# Altium footprint library LOGTURTLE_APR_25_TX.PcbLib: 88 footprints (part 1 of 6)
Each footprint in its own frame and in the unit in brackets; x right, y up, seen from the top. Pads: shape width x height; smd on the part's side, far side on the other; paste and mask are expansions set on the pad; w line width, h text height; cw(c..) or ccw(c..) is an arc to the next point about the centre after c.
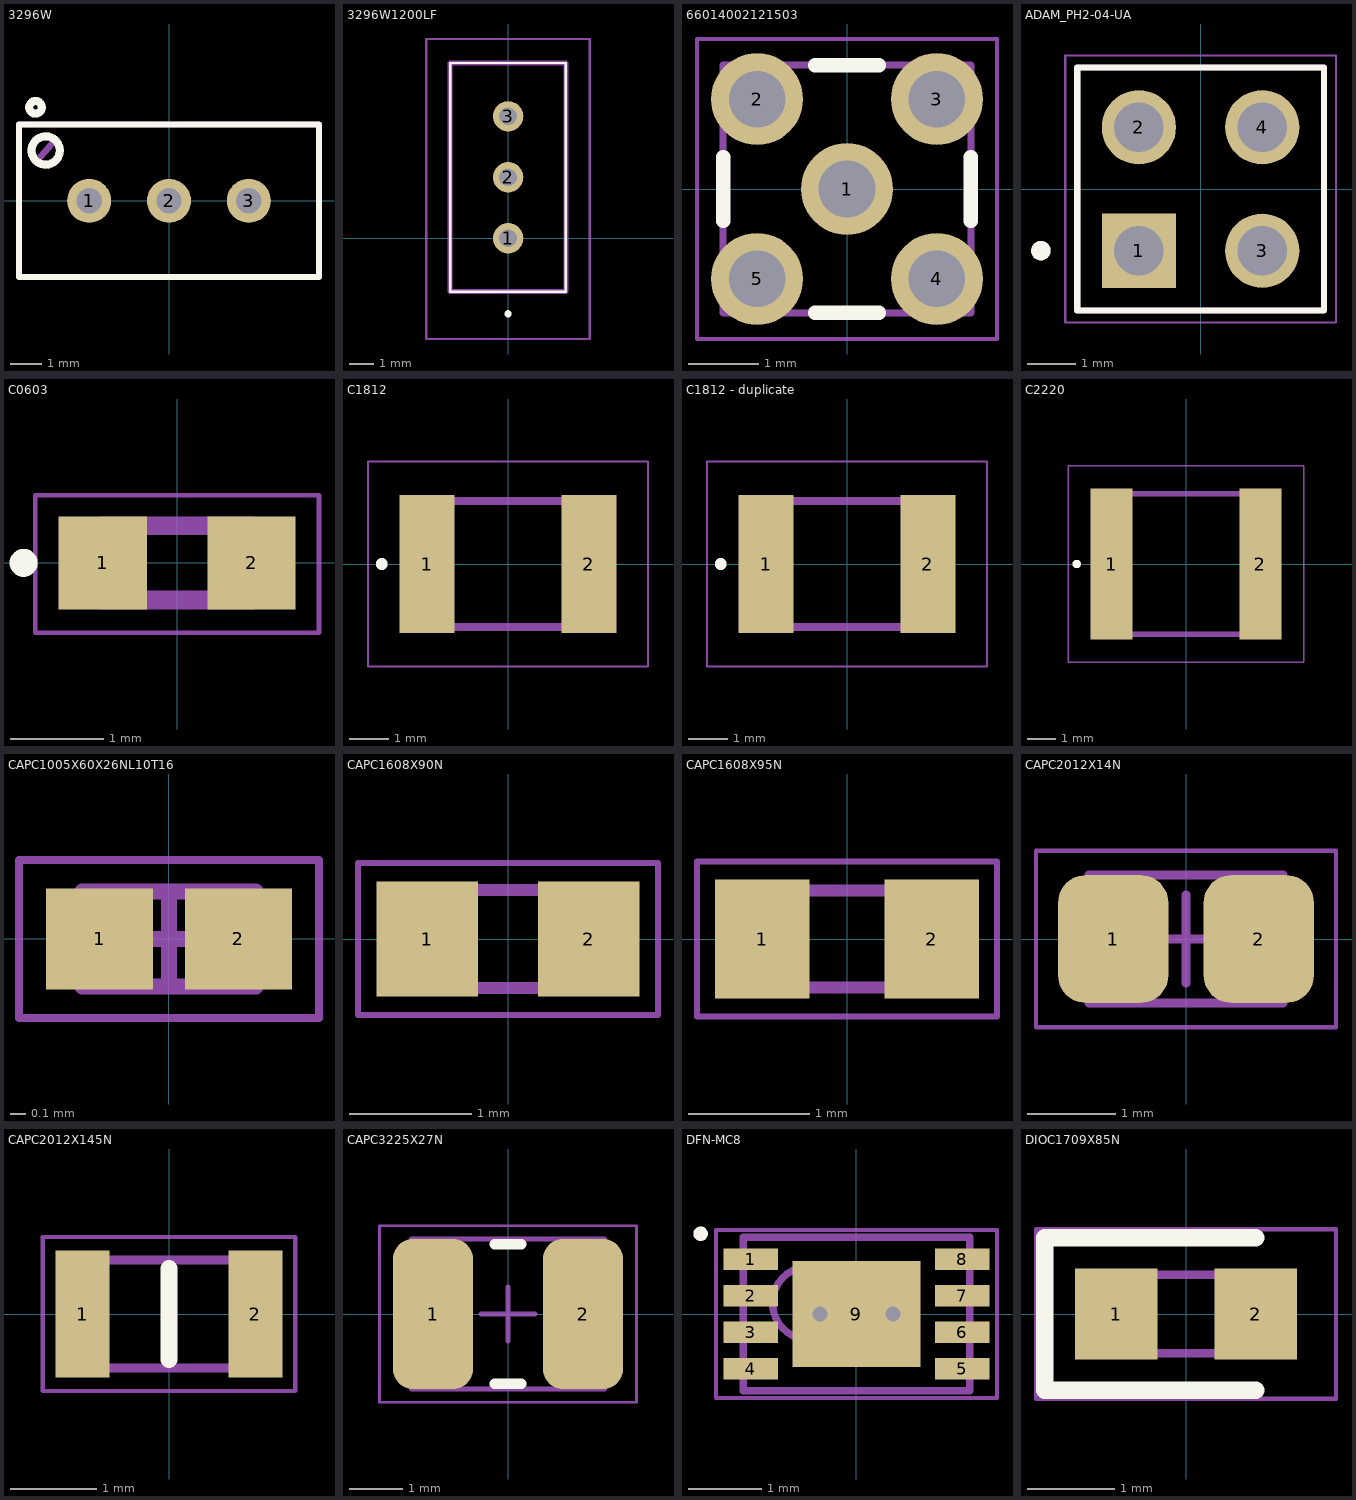
[diagram p0: the footprints below, top view; thin cyan lines are the x and y axes]

## 3296W [mm]
height 1.75
pads (3):
  round 1.4 hole 0.8: 1(-2.54,0) 2(0,0) 3(2.54,0)
Top Overlay:
  circle w0.254: c-3.925,1.6 r0.451
  lines w0.2: -4.775,-2.425 4.775,-2.425 4.775,2.425 -4.775,2.425 -4.775,-2.425
  lines w0.254: -4.053,3.008 ccw(c-4.25,2.975) -4.05,2.975
Mechanical 13:
  circle w0.254: c-3.925,1.6 r0.45
  lines w0.2: -4.2,1.275 -3.625,1.925 ; -4.775,-2.425 4.775,-2.425 4.775,2.425 -4.775,2.425 -4.775,-2.425
  text ".Designator" at -4.05,-1.727 h2
3D body "3296W-1-203LF.step": height 11.55, standoff -7.72, extent -4.765,-2.41 4.765,2.42

## 3296W1200LF [mm]
pads (3):
  round 1.269 hole 0.74: 1(0,0) 2(0,2.54) 3(0,5.08)
Top Overlay:
  lines w0.1: -2.42,-2.225 2.41,-2.225 2.41,7.305 -2.42,7.305 -2.42,-2.225
  lines w0.2: 0,-3.2 cw(c0,-3.15) 0,-3.1 ; 0,-3.2 ccw(c0,-3.15) 0,-3.1 ; 0,-3.2 cw(c0,-3.15) 0,-3.1
Mechanical 13:
  lines w0.2: -2.42,-2.225 2.41,-2.225 2.41,7.305 -2.42,7.305 -2.42,-2.225
Mechanical 15:
  lines w0.1: -3.42,-4.2 3.41,-4.2 3.41,8.305 -3.42,8.305 -3.42,-4.2
3D body "3296W-1-200LF.stp": height 10.38, standoff -5, extent -2.42,-2.225 2.41,7.305

## 66014002121503 [mm] "MMCX PCB THT Plug"
height 4.5
pads (5):
  round 1.3 hole 0.8 paste-2539.97: 1(0,0) 2(-1.27,1.27) 3(1.27,1.27) 4(1.27,-1.27) 5(-1.27,-1.27)
Top Overlay:
  lines w0.2: -1.75,-0.45 -1.75,0.45 ; -0.45,-1.75 0.45,-1.75 ; -0.45,1.75 0.45,1.75 ; 1.75,-0.45 1.75,0.45
Top 3D Body:
  lines w0.1: -1.75,-1.75 -1.75,1.75 1.75,1.75 1.75,-1.75 -1.75,-1.75
Top Courtyard:
  lines w0.05: -0.5,0 0.5,0 ; 0,-0.5 0,0.5 ; -2.12,-2.12 2.12,-2.12 2.12,2.12 -2.12,2.12 -2.12,-2.12
Top Designator:
  text ".Designator" at -4.998,-0.333 h1
Top Component Outline:
  lines w0.1: -1.75,-1.75 1.75,-1.75 1.75,1.75 -1.75,1.75 -1.75,-1.75
3D body "66014002121503.stp": height 4.5, standoff -2.5, extent -1.75,-1.75 1.75,1.75

## ADAM_PH2-04-UA [mm]
pads (4):
  rect 1.53x1.53 / inner round 1.53 / far side rect 1.53x1.53 hole 1.02: 1(-1.27,-1.27)
  round 1.53 hole 1.02: 2(-1.27,1.27) 3(1.27,-1.27) 4(1.27,1.27)
Top Overlay:
  circle w0.2: c-3.29,-1.27 r0.1
  lines w0.127: -2.54,-2.5 2.54,-2.5 2.54,2.5 -2.54,2.5 -2.54,-2.5
Mechanical 13:
  circle w0.2: c-3.29,-1.27 r0.1
  lines w0.127: -2.54,-2.5 2.54,-2.5 2.54,2.5 -2.54,2.5 -2.54,-2.5
Mechanical 15:
  lines w0.05: -2.79,-2.75 2.79,-2.75 2.79,2.75 -2.79,2.75 -2.79,-2.75

## C0603 [mm]
pads (2):
  rect 0.95x1 smd: 1(-0.8,0) 2(0.8,0)
Top Overlay:
  circle w0.2: c-1.65,0 r0.05
Mechanical 13:
  lines w0.2: -0.8,-0.4 -0.8,0.4 0.8,0.4 0.8,-0.4 -0.8,-0.4
Mechanical 15:
  lines w0.05: -1.525,-0.75 -1.525,0.725 1.525,0.725 1.525,-0.75 -1.525,-0.75
3D body "C0603C103K5RACTU.stp": height 0.87, standoff 0, extent -0.875,-0.475 0.875,0.475

## C1812 [mm]
pads (2):
  rect 1.4x3.5 smd: 1(-2.05,0) 2(2.05,0)
Top Overlay:
  circle w0.2: c-3.2,0 r0.05
Mechanical 13:
  lines w0.2: -2.25,-1.6 -2.25,1.6 2.25,1.6 2.25,-1.6 -2.25,-1.6
Mechanical 15:
  lines w0.05: -3.55,-2.6 -3.55,2.6 3.55,2.6 3.55,-2.6 -3.55,-2.6
3D body "C1812C102JDGACAUTO.stp": height 1.4, standoff 0, extent -2.398,-1.751 2.402,1.749

## C1812 - duplicate [mm]
pads (2):
  rect 1.4x3.5 smd: 1(-2.05,0) 2(2.05,0)
Top Overlay:
  circle w0.2: c-3.2,0 r0.05
Mechanical 13:
  lines w0.2: -2.25,-1.6 2.25,-1.6 2.25,1.6 -2.25,1.6 -2.25,-1.6
Mechanical 15:
  lines w0.05: -3.55,-2.6 3.55,-2.6 3.55,2.6 -3.55,2.6 -3.55,-2.6
3D body "C1812C102JDGACAUTO.stp": height 1.4, standoff 0, extent -2.398,-1.751 2.402,1.749

## C2220 [mm]
pads (2):
  rect 1.5x5.4 smd: 1(-2.65,0) 2(2.65,0)
Top Overlay:
  circle w0.2: c-3.9,0 r0.05
Mechanical 13:
  lines w0.2: -2.85,-2.5 -2.85,2.5 2.85,2.5 2.85,-2.5 -2.85,-2.5
Mechanical 15:
  lines w0.05: -4.2,-3.5 -4.2,3.5 4.2,3.5 4.2,-3.5 -4.2,-3.5
3D body "C2220C102JGGACTU.stp": height 1.8, standoff 0, extent -3.05,-2.7 3.05,2.7

## CAPC1005X60X26NL10T16 [mm] "Chip Capacitor, 2-Leads, Body 1.00x0.50mm, IPC Medium Density"
height 0.6
pads (2):
  rect 0.68x0.64 smd: 1(-0.44,0) 2(0.44,0)
Mechanical 13:
  lines w0.1: -0.55,-0.3 -0.55,0.3 0.55,0.3 0.55,-0.3 -0.55,-0.3
Mechanical 15:
  lines w0.05: -0.95,-0.5 -0.95,0.5 0.95,0.5 0.95,-0.5 -0.95,-0.5
  lines w0.1: -0.3,0 0.3,0 ; 0,-0.3 0,0.3
3D body: height 0.6, standoff 0, extent -0.29,-0.3 0.29,0.3
3D body: height 0.6, standoff 0, extent -0.55,-0.3 -0.29,0.3
3D body: height 0.6, standoff 0, extent 0.29,-0.3 0.55,0.3

## CAPC1608X90N [mm]
pads (2):
  rect 0.83x0.94 smd: 1(-0.66,0) 2(0.66,0)
Mechanical 13:
  lines w0.1: -0.8,-0.4 -0.8,0.4 0.8,0.4 0.8,-0.4 -0.8,-0.4
Mechanical 15:
  lines w0.05: -1.225,-0.62 -1.225,0.62 1.225,0.62 1.225,-0.62 -1.225,-0.62
3D body "CC0603KRX7R7BB104.stp": height 0.8, standoff 0, extent -0.803,-0.399 0.797,0.401

## CAPC1608X95N [mm]
pads (2):
  rect 0.78x0.98 smd: 1(-0.7,0) 2(0.7,0)
Mechanical 13:
  lines w0.1: -0.8,-0.4 -0.8,0.4 0.8,0.4 0.8,-0.4 -0.8,-0.4
Mechanical 15:
  lines w0.05: -1.24,-0.64 -1.24,0.64 1.24,0.64 1.24,-0.64 -1.24,-0.64
3D body "C0603C104K5RACTU7042.stp": height 0.87, standoff 0, extent -0.87,-0.48 0.88,0.47

## CAPC2012X14N [mm] "Chip Capacitor, 2-Leads, Body 2.00x1.25mm, IPC Medium Density"
height 1.45
pads (2):
  rrect50% 1.25x1.45 smd: 1(-0.825,0) 2(0.825,0)
Mechanical 13:
  lines w0.1: -1.1,-0.725 1.1,-0.725 1.1,0.725 -1.1,0.725 -1.1,-0.725
  text ".Designator" at -1.143,-0.285 h1.5
Mechanical 15:
  lines w0.05: -1.7,-1 1.7,-1 1.7,1 -1.7,1 -1.7,-1
  lines w0.1: -0.5,0 0.5,0 ; 0,-0.5 0,0.5
3D body "CAPC2012X14N.step": height 1.45, standoff 0, extent -1.1,-0.725 1.1,0.725

## CAPC2012X145N [mm]
pads (2):
  rect 0.62x1.47 smd: 1(-1,0) 2(1,0)
Top Overlay:
  lines w0.2: 0,-0.525 0,0.525
Mechanical 13:
  lines w0.1: -1,-0.625 1,-0.625 1,0.625 -1,0.625 -1,-0.625
Mechanical 15:
  lines w0.05: -1.46,-0.89 1.46,-0.89 1.46,0.89 -1.46,0.89 -1.46,-0.89
3D body "C2012X7S2A105M125AB.stp": height 1.25, standoff 0, extent -0.98,-0.8 1.02,0.8

## CAPC3225X27N [mm] "Chip Capacitor, 2-Leads, Body 3.20x2.50mm, IPC Medium Density"
height 2.7
pads (2):
  rrect50% 1.5x2.8 smd: 1(-1.4,0) 2(1.4,0)
Top Overlay:
  lines w0.2: -0.25,-1.3 0.25,-1.3 ; -0.25,1.3 0.25,1.3
Mechanical 13:
  lines w0.1: -1.8,-1.4 1.8,-1.4 1.8,1.4 -1.8,1.4 -1.8,-1.4
  text ".Designator" at -1.524,-0.285 h1.5
Mechanical 15:
  lines w0.05: -2.4,-1.65 2.4,-1.65 2.4,1.65 -2.4,1.65 -2.4,-1.65
  lines w0.1: -0.5,0 0.5,0 ; 0,-0.5 0,0.5
3D body "CAPC3225X27N.step": height 2.7, standoff 0, extent -1.8,-1.4 1.8,1.4

## DFN-MC8 [mm] "SON, 8-Leads, Body 2x3mm, Pitch 0.5mm, Microchip Recommended"
height 1
pads (9):
  rect 0.75x0.3 smd: 1(-1.45,0.75) 2(-1.45,0.25) 3(-1.45,-0.25) 4(-1.45,-0.75) 5(1.45,-0.75) 6(1.45,-0.25) 7(1.45,0.25) 8(1.45,0.75)
  rect 1.75x1.45 smd: 9(0,0)
via -0.5,0 diameter 0.5 hole 0.2
via 0.5,0 diameter 0.5 hole 0.2
Top Overlay:
  circle w0.1: c-2.135,1.1 r0.05
Mechanical 13:
  circle w0.1: c-0.65,0.15 r0.5
  lines w0.1: -1.55,-1.05 1.55,-1.05 1.55,1.05 -1.55,1.05 -1.55,-1.05
Mechanical 15:
  lines w0.05: -1.925,-1.15 1.925,-1.15 1.925,1.15 -1.925,1.15 -1.925,-1.15
  lines w0.1: -0.5,0 0.5,0 ; 0,-0.5 0,0.5
3D body: height 1, standoff 0, extent -1.549,-1.049 1.549,1.049

## DIOC1709X85N [mm]
pads (2):
  rect 0.95x1.05 smd: 1(-0.8,0) 2(0.8,0)
Top Overlay:
  lines w0.2: 0.8,-0.875 -1.625,-0.875 -1.625,0.875 0.8,0.875
Mechanical 13:
  lines w0.1: -0.85,-0.025 -0.375,0.45 ; -0.85,-0.45 0.85,-0.45 0.85,0.45 -0.85,0.45 -0.85,-0.45
Mechanical 15:
  lines w0.05: -1.725,-0.975 1.725,-0.975 1.725,0.975 -1.725,0.975 -1.725,-0.975
3D body "CD0603-Z5V1.stp": height 0.85, standoff 0, extent -0.85,-0.45 0.85,0.45